# Altium footprint library Footprint-1.PcbLib: 79 footprints (part 3 of 5)
Each footprint in its own frame and in the unit in brackets; x right, y up, seen from the top. Pads: shape width x height; smd on the part's side, far side on the other; paste and mask are expansions set on the pad; w line width, h text height; cw(c..) or ccw(c..) is an arc to the next point about the centre after c.
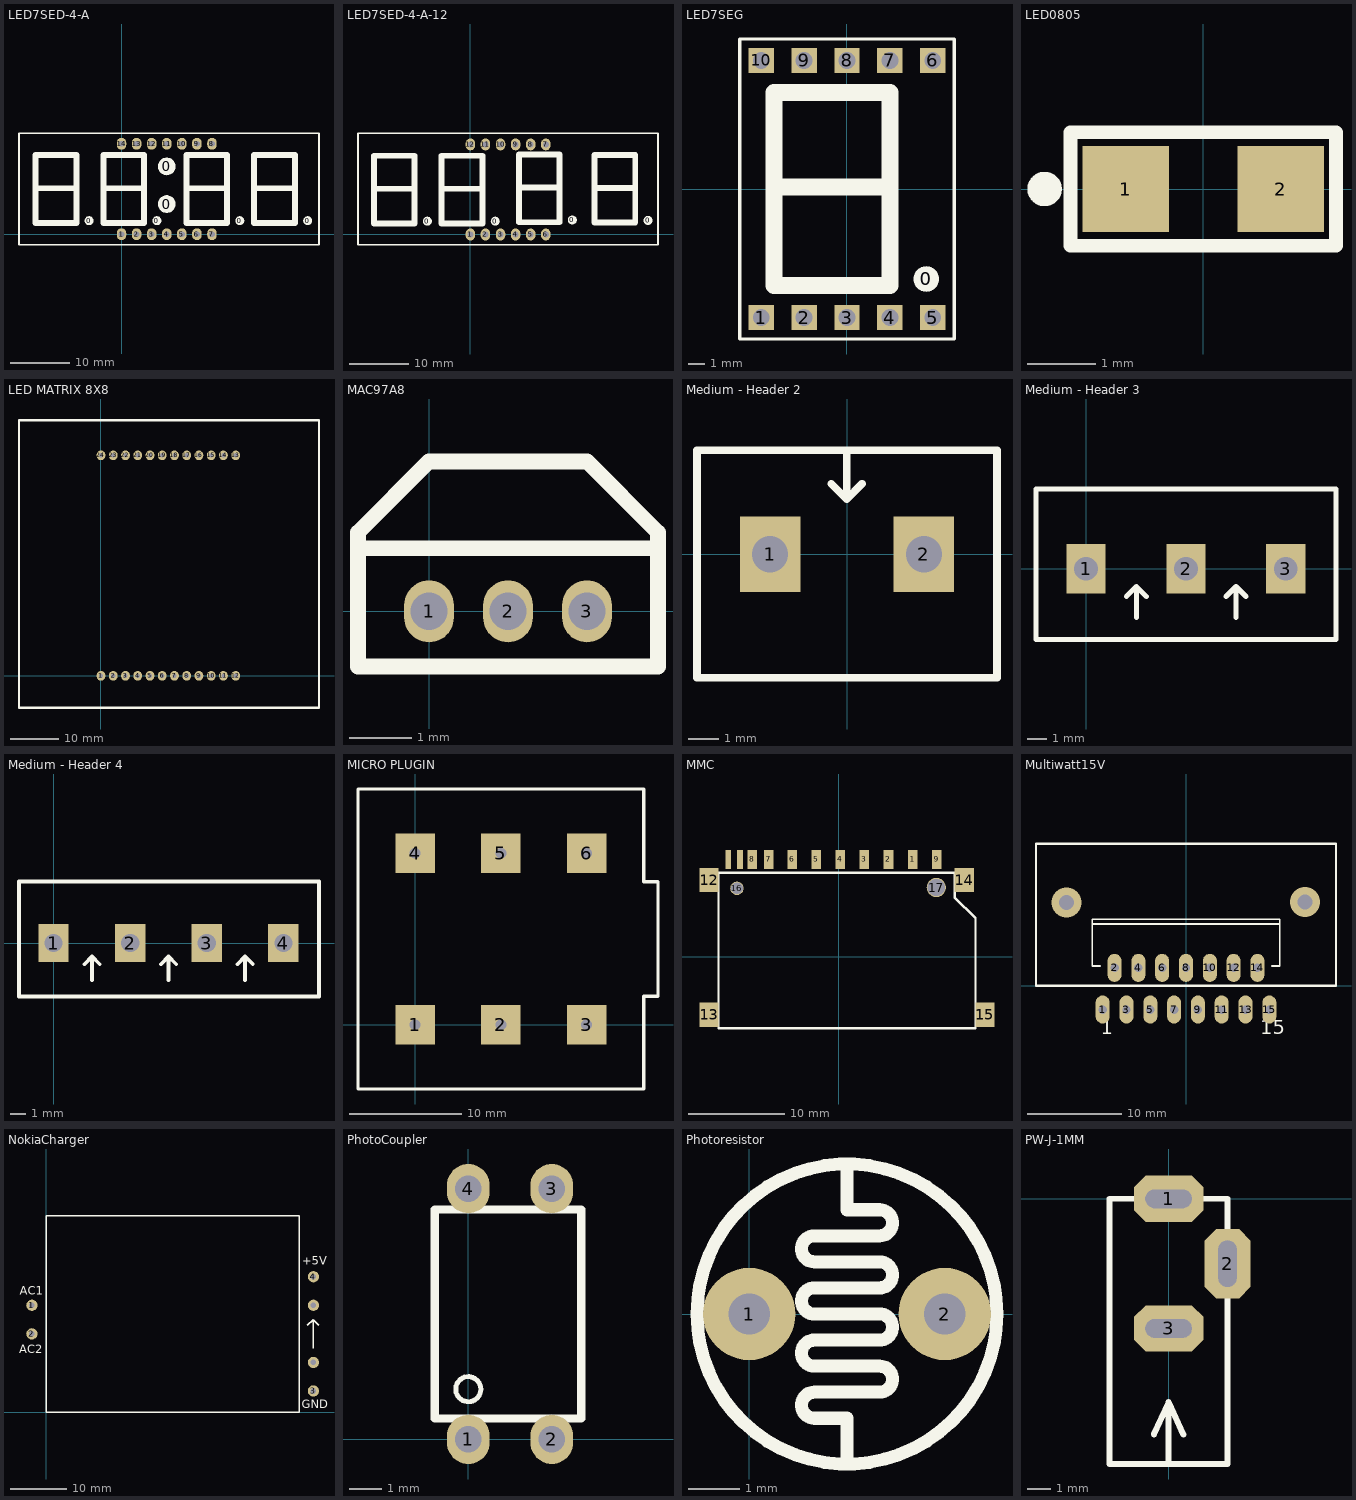
[diagram p2: the footprints below, top view; thin cyan lines are the x and y axes]

## LED7SED-4-A [mm]
pads (20):
  round 1.524 on Top Overlay: 0(-5.461,2.286) 0(5.969,2.286) 0(19.939,2.286) 0(31.369,2.286)
  round 3 on Top Overlay: 0(7.62,5.08) 0(7.62,11.43)
  oval 1.6x2 hole 1: 1(0,0) 2(2.54,0) 3(5.08,0) 4(7.62,0) 5(10.16,0) 6(12.7,0) 7(15.24,0) 8(15.24,15.24) 9(12.7,15.24) 10(10.16,15.24) 11(7.62,15.24) 12(5.08,15.24) 13(2.54,15.24) 14(0,15.24)
Top Overlay:
  lines w0.254: -17.272,-1.778 -17.272,17.018 33.274,17.018 33.274,-1.778 -17.272,-1.778
  lines w1: -14.351,7.747 -7.62,7.747 ; -2.921,7.747 3.81,7.747 ; 11.049,7.747 17.78,7.747 ; 22.479,7.747 29.21,7.747 ; -14.478,1.905 -14.478,13.335 -7.62,13.335 -7.62,1.905 -14.478,1.905 ; -3.048,1.905 -3.048,13.335 3.81,13.335 3.81,1.905 -3.048,1.905 ; 10.922,1.905 10.922,13.335 17.78,13.335 17.78,1.905 10.922,1.905 ; 22.352,1.905 22.352,13.335 29.21,13.335 29.21,1.905 22.352,1.905
3D body: height 8.03, standoff -3.97, extent 20.701,-1.88 33.401,17.17
3D body: height 8.03, standoff -3.97, extent 8.001,-1.88 20.701,17.17
3D body: height 8.03, standoff -3.97, extent -4.699,-1.88 8.001,17.17
3D body: height 8.03, standoff -3.97, extent -17.38,-1.88 -4.68,17.17

## LED7SED-4-A-12 [mm]
pads (16):
  round 1.524 on Top Overlay: 0(-7.239,2.235) 0(4.191,2.235) 0(17.17,2.438) 0(29.921,2.362)
  oval 1.6x2 hole 1: 1(0,0) 2(2.54,0) 3(5.08,0) 4(7.62,0) 5(10.16,0) 6(12.7,0) 7(12.7,15.164) 8(10.16,15.164) 9(7.62,15.164) 10(5.08,15.164) 11(2.54,15.164) 12(0,15.164)
Top Overlay:
  lines w0.254: -18.923,-1.702 31.598,-1.702 31.598,17.018 -18.923,17.018 -18.923,-1.702
  lines w1: -16.129,7.696 -9.398,7.696 ; -4.699,7.696 2.032,7.696 ; 8.28,7.899 15.011,7.899 ; 21.031,7.823 27.762,7.823 ; -16.256,1.854 -16.256,13.259 -9.398,13.259 -9.398,1.854 -16.256,1.854 ; -4.826,1.854 2.032,1.854 2.032,13.259 -4.826,13.259 -4.826,1.854 ; 8.153,2.057 15.011,2.057 15.011,13.487 8.153,13.487 8.153,2.057 ; 20.904,1.981 20.904,13.411 27.762,13.411 27.762,1.981 20.904,1.981
3D body: height 8.03, standoff -3.97, extent 19.05,-1.854 31.75,17.196
3D body: height 8.03, standoff -3.97, extent 6.35,-1.854 19.05,17.196
3D body: height 8.03, standoff -3.97, extent -6.35,-1.854 6.35,17.196
3D body: height 8.03, standoff -3.97, extent -19.05,-1.854 -6.35,17.196

## LED7SEG [mm] "LED7SEG"
pads (11):
  round 1.524 on Top Overlay: 0(4.724,-5.334)
  rect 1.5x1.5 hole 1: 1(-5.055,-7.62) 2(-2.515,-7.62) 3(0.025,-7.62) 4(2.565,-7.62) 5(5.105,-7.62) 6(5.105,7.62) 7(2.565,7.62) 8(0.025,7.62) 9(-2.515,7.62) 10(-5.055,7.62)
Top Overlay:
  lines w0.2: -6.325,-8.89 -6.325,8.89 6.375,8.89 6.375,-8.89 -6.325,-8.89
  lines w1: -4.166,0.127 2.565,0.127 ; -4.293,-5.715 2.565,-5.715 2.565,5.715 -4.293,5.715 -4.293,-5.715
3D body: height 8.03, standoff -3.97, extent -6.35,-9.525 6.35,9.525

## LED0805 [mil] "Chip Resistor; Body 2.0 x 1.3 mm (LxW typ)"
height 100
pads (2):
  rect 50x50 smd: 1(-45,0) 2(45,0)
Top Overlay:
  circle w10: c-92,0 r5
  lines w7.87: 77,32 77,-33 -77,-33 -77,33 77,33
3D body: height 19.68, standoff 0, extent -60,-25 60,25
3D body: height 47.24, standoff 19.68, extent -35,-25 35,25

## LED MATRIX 8X8 [mm]
pads (24):
  oval 1.8x2 hole 0.9: 1(0,0) 2(2.54,0) 3(5.08,0) 4(7.62,0) 5(10.16,0) 6(12.7,0) 7(15.24,0) 8(17.78,0) 9(20.32,0) 10(22.86,0) 11(25.4,0) 12(27.94,0) 13(27.94,45.72) 14(25.4,45.72) 15(22.86,45.72) 16(20.32,45.72) 17(17.78,45.72) 18(15.24,45.72) 19(12.7,45.72) 20(10.16,45.72) 21(7.62,45.72) 22(5.08,45.72) 23(2.54,45.72) 24(0,45.72)
Top Overlay:
  lines w0.5: -17.006,-6.65 45.224,-6.65 45.224,53.04 -2.401,53.04 -17.006,53.04 -17.006,-6.65

## MAC97A8 [mm]
pads (3):
  oval 0.8x1 hole 0.6: 1(0,0) 2(1.27,0) 3(2.54,0)
Top Overlay:
  lines w0.254: -1.143,1.016 3.683,1.016 ; -1.143,1.016 -1.143,1.27 0,2.413 2.54,2.413 3.683,1.27 3.683,1.016 ; -1.143,1.016 -1.143,-0.889 3.683,-0.889 3.683,1.016

## Medium - Header 2 [mm]
pads (2):
  rect 2x2.5 hole 1.2: 1(-2.54,0) 2(2.54,0)
Top Overlay:
  lines w0.254: -0.521,2.324 -0.013,1.816 ; -0.013,3.378 -0.013,1.816 ; 0.495,2.324 -0.013,1.816 ; -4.953,-4.077 4.953,-4.077 4.953,3.429 -4.953,3.429 -4.953,-4.077
3D body: height 10, standoff -4, extent -5,-4.071 5,3.429

## Medium - Header 3 [mm]
pads (3):
  rect 2x2.5 hole 1.2: 1(0,0) 2(5.08,0) 3(10.147,0)
Top Overlay:
  lines w0.254: 2.045,-1.41 2.553,-0.902 ; 2.553,-2.464 2.553,-0.902 ; 3.061,-1.41 2.553,-0.902 ; 7.112,-1.41 7.62,-0.902 ; 7.62,-2.464 7.62,-0.902 ; 8.128,-1.41 7.62,-0.902 ; -2.54,-3.581 -2.54,4.064 12.7,4.064 12.7,-3.581 -2.54,-3.581
3D body: height 10, standoff -4, extent -2.42,-3.505 12.58,3.995

## Medium - Header 4 [mm]
pads (4):
  rect 2x2.5 hole 1.2: 1(0,0) 2(5.08,0) 3(10.147,0) 4(15.215,0)
Top Overlay:
  lines w0.254: 2.045,-1.41 2.553,-0.902 ; 2.553,-2.464 2.553,-0.902 ; 3.061,-1.41 2.553,-0.902 ; 7.112,-1.41 7.62,-0.902 ; 7.62,-2.464 7.62,-0.902 ; 8.128,-1.41 7.62,-0.902 ; 12.179,-1.41 12.687,-0.902 ; 12.687,-2.464 12.687,-0.902 ; 13.195,-1.41 12.687,-0.902 ; -2.286,-3.531 17.577,-3.531 17.577,4.064 -2.286,4.064 -2.286,-3.531
3D body: height 10, standoff -4, extent -2.362,-3.429 17.638,4.071

## MICRO PLUGIN [mil]
pads (6):
  rect 137.8x137.8 / inner round 62 / far side rect 137.8x137.8 hole 38: 1(0,0) 2(300,0) 3(600,0) 4(0,600) 5(300,600) 6(600,600)
Top Overlay:
  lines w11.82: -200,-225 -200,825 800,825 800,500 850,500 850,100 800,100 800,-225 -200,-225

## MMC [mm]
pads (17):
  rect 1x2 smd: 1(7.67,10.109) 2(5.17,10.109) 3(2.67,10.109) 4(0.17,10.109) 5(-2.33,10.109) 6(-4.83,10.109) 7(-7.255,10.109) 8(-8.955,10.109) 9(10.17,10.109)
  rect 0.6x2 smd: 10(-10.255,10.109) 11(-11.455,10.109)
  rect 2x2.5 smd: 12(-13.455,7.95) 13(-13.455,-6.02) 14(13.024,7.95) 15(15.183,-6.02)
  round 1.4 hole 1.2: 16(-10.555,7.109)
  round 2 hole 1.8: 17(10.135,7.188)
Top Overlay:
  lines w0.254: -12.471,-7.417 14.199,-7.417 14.199,4.013 12.04,6.172 12.04,8.712 -12.471,8.712 -12.471,-7.417
3D body: height 3, standoff -1, extent -13.436,-20.196 15.164,9.804

## Multiwatt15V [mm] "TO, Thru-Hole, Vertical, Heatsink Mounted; 15 Bent Staggered Leads; Pitch 1.27 mm"
height 21
pads (15):
  oval 1.5x3 hole 0.9: 1(-8.89,-2.54) 2(-7.62,1.905) 3(-6.35,-2.54) 4(-5.08,1.905) 5(-3.81,-2.54) 6(-2.54,1.905) 7(-1.27,-2.54) 8(0,1.905) 9(1.27,-2.54) 10(2.54,1.905) 11(3.81,-2.54) 12(5.08,1.905) 13(6.35,-2.54) 14(7.62,1.905) 15(8.89,-2.54)
via -12.763,8.903 diameter 3.2 hole 1.6
via 12.687,8.928 diameter 3.2 hole 1.6
Top Overlay:
  lines w0.2: -10,6.59 10,6.59 ; -9.144,2.09 -10,2.09 -10,7.09 10,7.09 10,2.09 9.144,2.09
  lines w0.254: -16,0 -16,15.136 16,15.136 16,0 -16,0
  text "15" at 7.94,-5.165 h1.5
  text "1" at -9.12,-5.165 h1.5
3D body: height 22.74, standoff -2.18, extent -9.8,-2.815 9.8,6.253

## NokiaCharger [mm]
pads (6):
  round 2 hole 1: 1(-2.54,19.05) 2(-2.54,13.97) 3(47.54,3.81) 4(47.54,24.13) TEMP(47.54,8.89) TEMP(47.54,19.05)
Top Overlay:
  lines w0.254: 46.482,15.494 47.498,16.51 ; 47.498,11.43 47.498,16.51 ; 48.514,15.494 47.498,16.51 ; 0,0 0,35 ; 0,0 45,0 ; 0,0 45,0 ; 0,35 45,35 ; 0,35 45,35 ; 45,0 45,35
  text "GND" at 45.466,0.762 h1.52
  text "+5V" at 45.593,26.289 h1.52
  text "AC1" at -4.699,20.955 h1.52
  text "AC2" at -4.826,10.541 h1.52

## PhotoCoupler [mm] "Opto quang"
pads (4):
  oval 1.3x1.5 hole 0.8: 1(0,0) 2(2.54,0) 3(2.54,7.62) 4(0,7.62)
Top Overlay:
  circle w0.15: c0,1.524 r0.381
  lines w0.254: -1.016,0.635 -1.016,6.985 3.429,6.985 3.429,0.635 -1.016,0.635
3D body: height 4.31, standoff -3.28, extent -1.532,-0.19 4.008,7.81

## Photoresistor [mm]
pads (2):
  round 1.8 hole 0.8: 1(0,0) 2(3.81,0)
Top Overlay:
  circle w0.254: c1.905,0 r2.924
  lines w0.254: 1.905,-2.921 1.905,-2.032 1.27,-2.032 cw(c1.27,-1.778) 1.27,-1.524 2.54,-1.524 ccw(c2.54,-1.27) 2.54,-1.016 1.27,-1.016 cw(c1.27,-0.762) 1.27,-0.508 2.54,-0.508 ccw(c2.54,-0.254) 2.54,0 1.27,0 cw(c1.27,0.254) 1.27,0.508 2.54,0.508 ccw(c2.54,0.762) 2.54,1.016 1.27,1.016 cw(c1.27,1.27) 1.27,1.524 2.54,1.524 ccw(c2.54,1.778) 2.54,2.032 1.905,2.032 1.905,2.921

## PW-J-1MM [mm] "Power Header 1mm"
pads (3):
  oct 3x2 hole 0.8 slot 2 at 0 deg paste+1: 1(0,0) 3(0,-5.588)
  oct 2x3 hole 0.8 slot 2 at 90 deg paste+1: 2(2.54,-2.794)
Top Overlay:
  lines w0.254: -0.635,-10.16 0,-8.763 ; 0,-11.43 0,-8.763 ; 0.635,-10.16 0,-8.763 ; -2.54,-11.43 -2.54,0 2.54,0 2.54,-11.43 -2.54,-11.43